# Altium integrated library EwgMicrochips.IntLib: 118 symbols (part 1 of 2) (continued)
## MAX9744
designator DD?
Усилитель аудио; Производитель: Maxim; Тип монтажа: Поверхностный; Характеристики: 20Вт класс D 5-12В стерео; Наименование: MAX9744; Тип компонента: Усилитель аудио
footprint VQFN44_P
pins: 0 PGND, 1 BOOT_L+, 2 OUT_L+, 3 OUT_L+, 4 PVDD, 5 PVDD, 6 VDD, 7 GND, 8 SDA/VOL, 9 SCL, 10 VDD, 11 GND, 12 GND, 13 ADDR1, 14 ADDR2, 15 GND, 16 IN_L, 17 FB_L, 18 FB_R, 19 IN_R, 20 BIAS, 21 VDD, 22 ~{SHDN}, 24 MUTE, 25 SYNC, 26 SYNCOUT, 27 GND, 28 VDD, 29 PVDD, 30 PVDD, 31 OUT_R+, 32 OUT_R+, 33 BOOT_R+, 34 PGND, 35 PGND, 36 OUT_R-, 37 OUT_R-, 38 BOOT_R-, 39 PGND, 40 BOOT_L-, 41 OUT_L-, 42 OUT_L-, 43 PGND, 44 PGND
text: ,

## MAX13443
designator DD?
Интерфейс RS485; Производитель: Maxim Semiconductor; Тип корпуса: SO8; Тип монтажа: Поверхностный; Характеристики: 10Мбит/с, 128 устройств на линии; Наименование: MAX13443; Тип компонента: Интерфейс RS485
footprint SO8
pins: 1 RO (out), 2 ~{RE}, 3 DE, 4 DI (in), 5 GND, 6 A, 7 B, 8 VCC

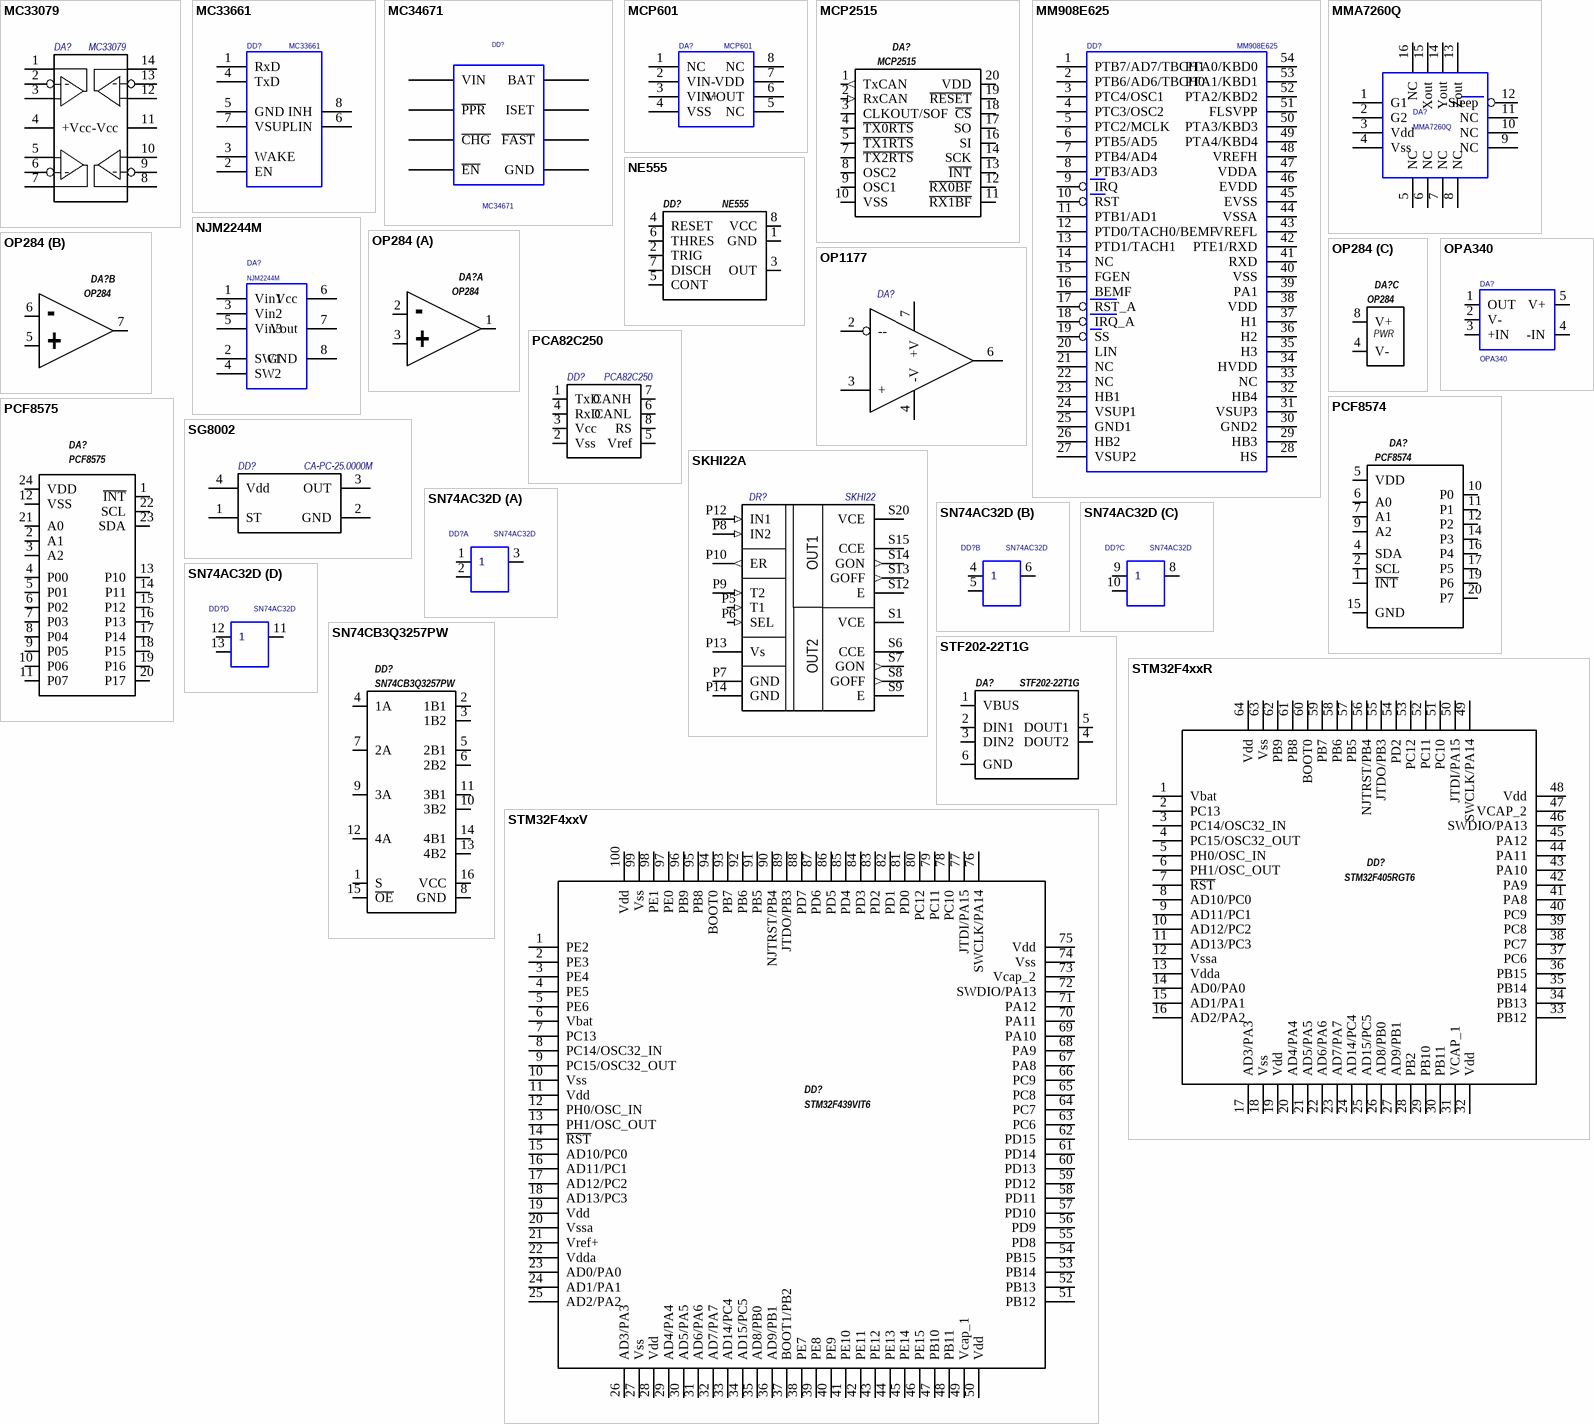
[diagram p5: symbols MC33079 to STM32F4xxV]

## MC33079
designator DA?
Микросхема - Операционный усилитель; Наименование: ON Semiconductor, MC33079D; Тип корпуса: SO14; Тип монтажа: Поверхностный; Тип компонента: Микросхема - Операционный усилитель
footprint SO14
pins: 1, 2, 3, 4 +Vcc, 5, 6, 7, 8, 9, 10, 11 -Vcc, 12, 13, 14

## MC33661
designator DD?
Микросхема - Драйвер LIN; Наименование: Freescale Semiconductor, MC33661; Тип корпуса: SO8; Тип монтажа: Поверхностный; Value: *; Тип компонента: Микросхема - Драйвер LIN
footprint SO8
pins: 1 RxD, 2 EN, 3 WAKE, 4 TxD, 5 GND, 6 LIN, 7 VSUP, 8 INH

## MC34671
designator DD?
Микросхема - Контроль заряда; Наименование: Freescale Semiconductor, MC34671AEPR2; Тип корпуса: UDFN; Тип монтажа: Поверхностный; Value: *; Тип компонента: Микросхема - Контроль заряда
footprint MC34671
pins: 1 VIN, 2 ~{PPR}, 3 ~{CHG}, 4 ~{EN}, 5 GND, 6 ~{FAST}, 7 ISET, 8 BAT, 9 hidden

## MCP601
designator DA?
Микросхема - Операционный усилитель; Наименование: Microchip, MCP601-I/SN; Тип корпуса: SO8; Тип монтажа: Поверхностный; Value: *; Тип компонента: Микросхема - Операционный усилитель
footprint SO8
pins: 1 NC, 2 VIN-, 3 VIN+, 4 VSS, 5 NC, 6 VOUT, 7 VDD, 8 NC

## MCP2515
designator DA?
Интерфейс CAN SPI; Производитель: Microchip; Тип корпуса: SSOP20; Тип монтажа: Поверхностный; Характеристики: 1Мб/с; Наименование: MCP2515; Тип компонента: Интерфейс CAN SPI
footprint SSOP20-4.4
pins: 1 TxCAN (out), 2 RxCAN (in), 3 CLKOUT/SOF, 4 ~{TX0RTS}, 5 ~{TX1RTS}, 7 ~{TX2RTS}, 8 OSC2, 9 OSC1, 10 VSS, 11 ~{RX1BF}, 12 ~{RX0BF}, 13 ~{INT}, 14 SCK, 16 SI, 17 SO, 18 ~{CS}, 19 ~{RESET}, 20 VDD

## MM908E625
designator DD?
Микросхема - Драйвер двигателя; Наименование: Freescale Semiconductor, MM908E625; Тип корпуса: SOIC54_WB-EP; Тип монтажа: Поверхностный; Value: *; Тип компонента: Микросхема - Драйвер двигателя
footprint SOIC54_WB-EP
pins: 1 PTB7/AD7/TBCH1, 2 PTB6/AD6/TBCH0, 3 PTC4/OSC1, 4 PTC3/OSC2, 5 PTC2/MCLK, 6 PTB5/AD5, 7 PTB4/AD4, 8 PTB3/AD3, 9 IRQ, 10 RST, 11 PTB1/AD1, 12 PTD0/TACH0/BEMF, 13 PTD1/TACH1, 14 NC, 15 FGEN, 16 BEMF, 17 RST_A, 18 IRQ_A, 19 SS, 20 LIN, 21 NC, 22 NC, 23 HB1, 24 VSUP1, 25 GND1, 26 HB2, 27 VSUP2, 28 HS, 29 HB3, 30 GND2, 31 VSUP3, 32 HB4, 33 NC, 34 HVDD, 35 H3, 36 H2, 37 H1, 38 VDD, 39 PA1, 40 VSS, 41 RXD, 42 PTE1/RXD, 43 VREFL, 44 VSSA, 45 EVSS, 46 EVDD, 47 VDDA, 48 VREFH, 49 PTA4/KBD4, 50 PTA3/KBD3, 51 FLSVPP, 52 PTA2/KBD2, 53 PTA1/KBD1, 54 PTA0/KBD0, 55 GND (power) hidden

## MMA7260Q
designator DA?
Датчик - Акселерометр; Наименование: Freescale, MMA7260Q; Тип корпуса: QFN; Тип монтажа: Поверхностный; Value: *; Тип компонента: Датчик - Акселерометр
footprint QFN
pins: 1 G1, 2 G2, 3 Vdd, 4 Vss, 5 NC, 6 NC, 7 NC, 8 NC, 9 NC, 10 NC, 11 NC, 12 Sleep, 13 Zout, 14 Yout, 15 Xout, 16 NC, 17 hidden

## NE555
designator DD?
Таймер аналоговый; Примечание: Texas Instruments; Тип корпуса: SO8-3.9; Тип монтажа: Поверхностный; Наименование: NE555
footprint SO8-3.9
pins: 1 GND, 2 TRIG, 3 OUT, 4 RESET, 5 CONT, 6 THRES, 7 DISCH, 8 VCC

## NJM2244M
designator DA?
Микросхема - Видео переключатель; Наименование: JRC, NJM2244M; Тип корпуса: SO8; Тип монтажа: Поверхностный; Value: *; Тип компонента: Микросхема - Видео переключатель
footprint SO8
pins: 1 Vin1, 2 SW1, 3 Vin2, 4 SW2, 5 Vin3, 6 Vcc, 7 Vout, 8 GND

## OP284
designator DA?
Операционный усилитель; Производитель: Analog Devices; Тип корпуса: SO8; Тип монтажа: Поверхностный; Характеристики: 3-36В, 10мА, rail-to-rail 200мВ, 4МГц; Наименование: OP284; Тип компонента: Операционный усилитель
footprint SO8-3.9
part A pins: 1 outA, 2 -inA, 3 +inA
part B pins: 5 +inB, 6 -inB, 7 outB
part C pins: 4 V-, 8 V+
part A text: -; +
part B text: -; +
part C text: PWR

## OP1177
designator DA?  (value not drawn)
Микросхема - Операционный усилитель; Наименование: Analog Devices, OP1177; Тип корпуса: SO8; Тип монтажа: Поверхностный; Тип компонента: Микросхема - Операционный усилитель
footprint SO8
pins: 2 --, 3 +, 4 -V, 6 Vout, 7 +V

## OPA340
designator DA?
Микросхема - Операционный усилитель; Наименование: Texas Instruments, OPA340NA/250; Тип корпуса: SOT-23-5; Тип монтажа: Поверхностный; Value: *; Тип компонента: Микросхема - Операционный усилитель
footprint SOT23-5
pins: 1 OUT, 2 V-, 3 +IN, 4 -IN, 5 V+

## PCA82C250
designator DD?
Микросхема - Драйвер CAN; Наименование: NXP, PCA82C250T; Тип корпуса: SO8; Тип монтажа: Поверхностный; Value: *; Тип компонента: Микросхема - Драйвер CAN
footprint SO8
pins: 1 TxD, 2 Vss, 3 Vcc, 4 RxD, 5 Vref, 6 CANL, 7 CANH, 8 RS
1 alternate drawing of the same symbol

## PCF8574
designator DA?
Расширитель ввода-вывода 8 кан.; Производитель: NXP; Тип корпуса: SSOP20; Тип монтажа: Поверхностный; Наименование: PCF8574; Тип компонента: Расширитель ввода-вывода 8 кан.
footprint SSOP20-4.4
pins: 1 ~{INT}, 2 SCL, 4 SDA, 5 VDD, 6 A0, 7 A1, 9 A2, 10 P0, 11 P1, 12 P2, 14 P3, 15 GND, 16 P4, 17 P5, 19 P6, 20 P7

## PCF8575
designator DA?
Расширитель ввода-вывода 8 кан.; Производитель: NXP; Тип корпуса: SSOP20; Тип монтажа: Поверхностный; Наименование: PCF8575; Тип компонента: Расширитель ввода-вывода 8 кан.
footprint SSOP24-5.3
pins: 1 ~{INT}, 2 A1, 3 A2, 4 P00, 5 P01, 6 P02, 7 P03, 8 P04, 9 P05, 10 P06, 11 P07, 12 VSS, 13 P10, 14 P11, 15 P12, 16 P13, 17 P14, 18 P15, 19 P16, 20 P17, 21 A0, 22 SCL, 23 SDA, 24 VDD

## SG8002
designator DD?, comment CA-PC-25.0000M
Прогр. генератор Мгц; Наименование: SG-8002CA-25.000 M SCM Epson; Примечание: SG-8002JF-40.000 M SCM Epson; Тип монтажа: Поверхностный; Value: CA-PC-25.0000M; Тип компонента: Прогр. генератор Мгц
footprint SG8002 (PROGRAMMABLE HIGH-FREQUENCY CRYSTAL OSCILLATOR)
pins: 1 ST, 2 GND, 3 OUT, 4 Vdd

## SKHI22A
designator DR?, comment SKHI22
Микросхема - Драйвер IGBT; Наименование: SEMIKRON, SKHI22A/R; Тип монтажа: Штыревой; Value: *; Тип компонента: Микросхема - Драйвер IGBT
footprint SKHI22 (IGBT DRIVER)
pins: P5 T1 (in), P6 SEL (in), P7 GND (power), P8 IN2 (in), P9 T2 (in), P10 ER (out), P11 NC hidden, P12 IN1 (in), P13 Vs (power), P14 GND (power), S1 VCE, S6 CCE, S7 GON (out), S8 GOFF (out), S9 E, S12 E, S13 GOFF (out), S14 GON (out), S15 CCE, S20 VCE
text: OUT1; OUT2

## SN74AC32D
designator DD?
Микросхема - Логика; Тип корпуса: SO14; Тип монтажа: Поверхностный; Value: *; Наименование: SN74AC32D; Тип компонента: Микросхема - Логика
footprint SO14
pins on every part: 7 GND (power) hidden, 14 5V (power) hidden
part A pins: 1 1A, 2 1B, 3 1Y
part B pins: 4 2A, 5 2B, 6 2Y
part C pins: 8 3Y, 9 3A, 10 3B
part D pins: 11 4Y, 12 4A, 13 4B

## SN74CB3Q3257PW
designator DD?
Мультиплексор 2:1 4кан.; Производитель: Texas Instruments; Тип корпуса: TSSOP16; Тип монтажа: Поверхностный; Характеристики: 500МГц 6.5нс; Наименование: SN74CB3Q3257PW
footprint SSOP16-4.4
pins: 1 S, 2 1B1, 3 1B2, 4 1A, 5 2B1, 6 2B2, 7 2A, 8 GND, 9 3A, 10 3B2, 11 3B1, 12 4A, 13 4B2, 14 4B1, 15 ~{OE}, 16 VCC

## STF202-22T1G
designator DA?
Интерфейс USB защита+фильтр; Производитель: ON Semiconductor; Тип корпуса: SOT23-6; Тип монтажа: Поверхностный; Наименование: STF202-22T1G; Тип компонента: Интерфейс USB защита+фильтр
footprint SOT23-6
pins: 1 VBUS, 2 DIN1, 3 DIN2, 4 DOUT2, 5 DOUT1, 6 GND

## STM32F4xxR
designator DD?, comment STM32F405RGT6
Микроконтроллер; Производитель: STMicroelectronics; Тип корпуса: LQFP64; Тип монтажа: Поверхностный; Наименование: STM32F405RGT6; Тип компонента: Микроконтроллер
footprint LQFP64
pins: 1 Vbat, 2 PC13, 3 PC14/OSC32_IN, 4 PC15/OSC32_OUT, 5 PH0/OSC_IN, 6 PH1/OSC_OUT, 7 ~{RST}, 8 AD10/PC0, 9 AD11/PC1, 10 AD12/PC2, 11 AD13/PC3, 12 Vssa, 13 Vdda, 14 AD0/PA0, 15 AD1/PA1, 16 AD2/PA2, 17 AD3/PA3, 18 Vss, 19 Vdd, 20 AD4/PA4, 21 AD5/PA5, 22 AD6/PA6, 23 AD7/PA7, 24 AD14/PC4, 25 AD15/PC5, 26 AD8/PB0, 27 AD9/PB1, 28 PB2, 29 PB10, 30 PB11, 31 VCAP_1, 32 Vdd, 33 PB12, 34 PB13, 35 PB14, 36 PB15, 37 PC6, 38 PC7, 39 PC8, 40 PC9, 41 PA8, 42 PA9, 43 PA10, 44 PA11, 45 PA12, 46 SWDIO/PA13, 47 VCAP_2, 48 Vdd, 49 SWCLK/PA14, 50 JTDI/PA15, 51 PC10, 52 PC11, 53 PC12, 54 PD2, 55 JTDO/PB3, 56 NJTRST/PB4, 57 PB5, 58 PB6, 59 PB7, 60 BOOT0, 61 PB8, 62 PB9, 63 Vss, 64 Vdd

## STM32F4xxV
designator DD?, comment STM32F439VIT6
Микроконтроллер; Производитель: STMicroelectronics; Тип корпуса: LQFP100; Тип монтажа: Поверхностный; Наименование: STM32F439VIT6; Тип компонента: Микроконтроллер
footprint LQFP100
pins: 1 PE2, 2 PE3, 3 PE4, 4 PE5, 5 PE6, 6 Vbat, 7 PC13, 8 PC14/OSC32_IN, 9 PC15/OSC32_OUT, 10 Vss, 11 Vdd, 12 PH0/OSC_IN, 13 PH1/OSC_OUT, 14 ~{RST}, 15 AD10/PC0, 16 AD11/PC1, 17 AD12/PC2, 18 AD13/PC3, 19 Vdd, 20 Vssa, 21 Vref+, 22 Vdda, 23 AD0/PA0, 24 AD1/PA1, 25 AD2/PA2, 26 AD3/PA3, 27 Vss, 28 Vdd, 29 AD4/PA4, 30 AD5/PA5, 31 AD6/PA6, 32 AD7/PA7, 33 AD14/PC4, 34 AD15/PC5, 35 AD8/PB0, 36 AD9/PB1, 37 BOOT1/PB2, 38 PE7, 39 PE8, 40 PE9, 41 PE10, 42 PE11, 43 PE12, 44 PE13, 45 PE14, 46 PE15, 47 PB10, 48 PB11, 49 Vcap_1, 50 Vdd, 51 PB12, 52 PB13, 53 PB14, 54 PB15, 55 PD8, 56 PD9, 57 PD10, 58 PD11, 59 PD12, 60 PD13, 61 PD14, 62 PD15, 63 PC6, 64 PC7, 65 PC8, 66 PC9, 67 PA8, 68 PA9, 69 PA10, 70 PA11, 71 PA12, 72 SWDIO/PA13, 73 Vcap_2, 74 Vss, 75 Vdd, 76 SWCLK/PA14, 77 JTDI/PA15, 78 PC10, 79 PC11, 80 PC12, 81 PD0, 82 PD1, 83 PD2, 84 PD3, 85 PD4, 86 PD5, 87 PD6, 88 PD7, 89 JTDO/PB3, 90 NJTRST/PB4, 91 PB5, 92 PB6, 93 PB7, 94 BOOT0, 95 PB8, 96 PB9, 97 PE0, 98 PE1, 99 Vss, 100 Vdd

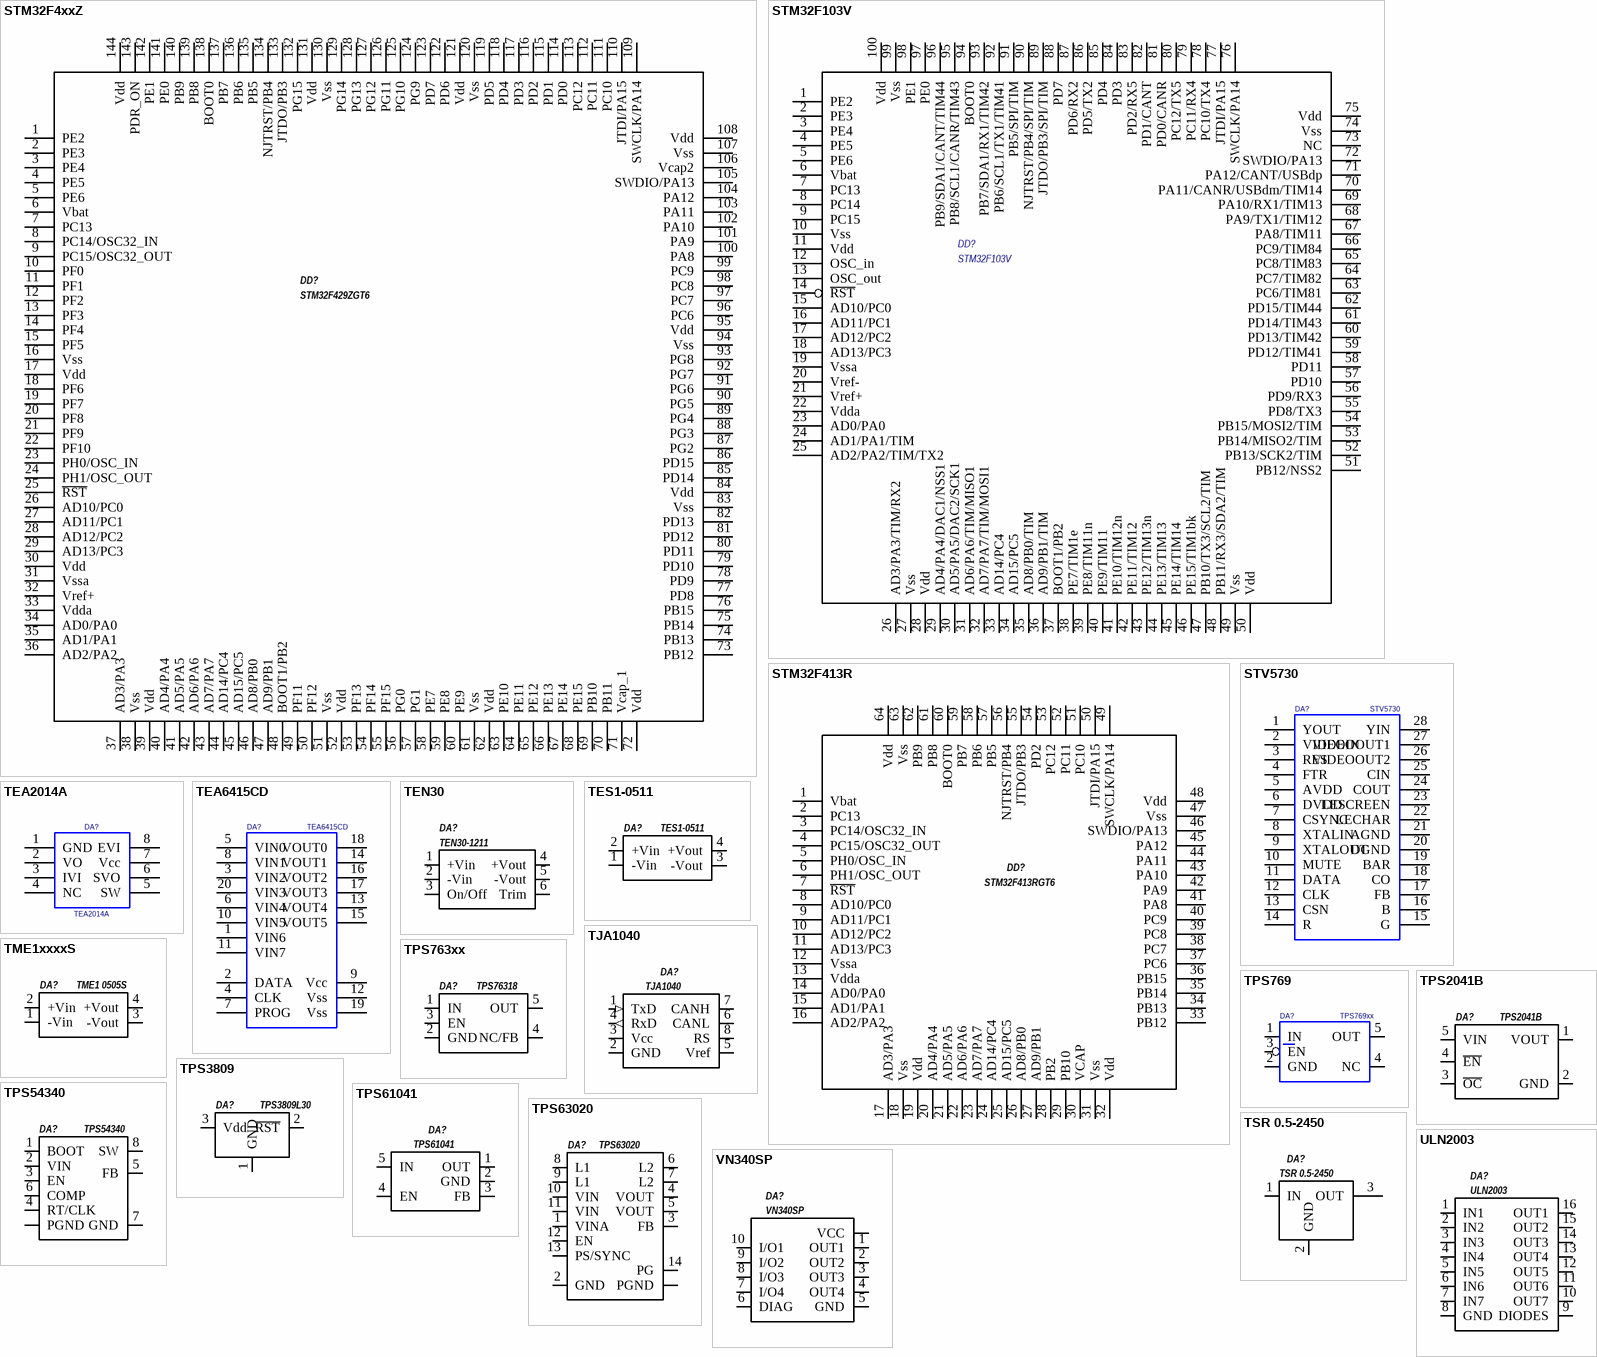
[diagram p6: symbols STM32F4xxZ to VN340SP]

## STM32F4xxZ
designator DD?, comment STM32F429ZGT6
Микроконтроллер; Производитель: STMicroelectronics; Тип корпуса: LQFP144; Тип монтажа: Поверхностный; Наименование: STM32F429ZGT6; Тип компонента: Микроконтроллер
footprint LQFP144
pins: 1 PE2, 2 PE3, 3 PE4, 4 PE5, 5 PE6, 6 Vbat, 7 PC13, 8 PC14/OSC32_IN, 9 PC15/OSC32_OUT, 10 PF0, 11 PF1, 12 PF2, 13 PF3, 14 PF4, 15 PF5, 16 Vss, 17 Vdd, 18 PF6, 19 PF7, 20 PF8, 21 PF9, 22 PF10, 23 PH0/OSC_IN, 24 PH1/OSC_OUT, 25 ~{RST}, 26 AD10/PC0, 27 AD11/PC1, 28 AD12/PC2, 29 AD13/PC3, 30 Vdd, 31 Vssa, 32 Vref+, 33 Vdda, 34 AD0/PA0, 35 AD1/PA1, 36 AD2/PA2, 37 AD3/PA3, 38 Vss, 39 Vdd, 40 AD4/PA4, 41 AD5/PA5, 42 AD6/PA6, 43 AD7/PA7, 44 AD14/PC4, 45 AD15/PC5, 46 AD8/PB0, 47 AD9/PB1, 48 BOOT1/PB2, 49 PF11, 50 PF12, 51 Vss, 52 Vdd, 53 PF13, 54 PF14, 55 PF15, 56 PG0, 57 PG1, 58 PE7, 59 PE8, 60 PE9, 61 Vss, 62 Vdd, 63 PE10, 64 PE11, 65 PE12, 66 PE13, 67 PE14, 68 PE15, 69 PB10, 70 PB11, 71 Vcap_1, 72 Vdd, 73 PB12, 74 PB13, 75 PB14, 76 PB15, 77 PD8, 78 PD9, 79 PD10, 80 PD11, 81 PD12, 82 PD13, 83 Vss, 84 Vdd, 85 PD14, 86 PD15, 87 PG2, 88 PG3, 89 PG4, 90 PG5, 91 PG6, 92 PG7, 93 PG8, 94 Vss, 95 Vdd, 96 PC6, 97 PC7, 98 PC8, 99 PC9, 100 PA8, 101 PA9, 102 PA10, 103 PA11, 104 PA12, 105 SWDIO/PA13, 106 Vcap2, 107 Vss, 108 Vdd, 109 SWCLK/PA14, 110 JTDI/PA15, 111 PC10, 112 PC11, 113 PC12, 114 PD0, 115 PD1, 116 PD2, 117 PD3, 118 PD4, 119 PD5, 120 Vss, 121 Vdd, 122 PD6, 123 PD7, 124 PG9, 125 PG10, 126 PG11, 127 PG12, 128 PG13, 129 PG14, 130 Vss, 131 Vdd, 132 PG15, 133 JTDO/PB3, 134 NJTRST/PB4, 135 PB5, 136 PB6, 137 PB7, 138 BOOT0, 139 PB8, 140 PB9, 141 PE0, 142 PE1, 143 PDR_ON, 144 Vdd

## STM32F103V
designator DD?
Микроконтроллер; Тип корпуса: LQFP100; Тип монтажа: Поверхностный; Value: STM32F103V; Наименование: STM32F103V; Тип компонента: Микроконтроллер
footprint LQFP100
pins: 1 PE2, 2 PE3, 3 PE4, 4 PE5, 5 PE6, 6 Vbat, 7 PC13, 8 PC14, 9 PC15, 10 Vss, 11 Vdd, 12 OSC_in, 13 OSC_out, 14 ~{RST}, 15 AD10/PC0, 16 AD11/PC1, 17 AD12/PC2, 18 AD13/PC3, 19 Vssa, 20 Vref-, 21 Vref+, 22 Vdda, 23 AD0/PA0, 24 AD1/PA1/TIM, 25 AD2/PA2/TIM/TX2, 26 AD3/PA3/TIM/RX2, 27 Vss, 28 Vdd, 29 AD4/PA4/DAC1/NSS1, 30 AD5/PA5/DAC2/SCK1, 31 AD6/PA6/TIM/MISO1, 32 AD7/PA7/TIM/MOSI1, 33 AD14/PC4, 34 AD15/PC5, 35 AD8/PB0/TIM, 36 AD9/PB1/TIM, 37 BOOT1/PB2, 38 PE7/TIM1e, 39 PE8/TIM11n, 40 PE9/TIM11, 41 PE10/TIM12n, 42 PE11/TIM12, 43 PE12/TIM13n, 44 PE13/TIM13, 45 PE14/TIM14, 46 PE15/TIM1bk, 47 PB10/TX3/SCL2/TIM, 48 PB11/RX3/SDA2/TIM, 49 Vss, 50 Vdd, 51 PB12/NSS2, 52 PB13/SCK2/TIM, 53 PB14/MISO2/TIM, 54 PB15/MOSI2/TIM, 55 PD8/TX3, 56 PD9/RX3, 57 PD10, 58 PD11, 59 PD12/TIM41, 60 PD13/TIM42, 61 PD14/TIM43, 62 PD15/TIM44, 63 PC6/TIM81, 64 PC7/TIM82, 65 PC8/TIM83, 66 PC9/TIM84, 67 PA8/TIM11, 68 PA9/TX1/TIM12, 69 PA10/RX1/TIM13, 70 PA11/CANR/USBdm/TIM14, 71 PA12/CANT/USBdp, 72 SWDIO/PA13, 73 NC, 74 Vss, 75 Vdd, 76 SWCLK/PA14, 77 JTDI/PA15, 78 PC10/TX4, 79 PC11/RX4, 80 PC12/TX5, 81 PD0/CANR, 82 PD1/CANT, 83 PD2/RX5, 84 PD3, 85 PD4, 86 PD5/TX2, 87 PD6/RX2, 88 PD7, 89 JTDO/PB3/SPI/TIM, 90 NJTRST/PB4/SPI/TIM, 91 PB5/SPI/TIM, 92 PB6/SCL1/TX1/TIM41, 93 PB7/SDA1/RX1/TIM42, 94 BOOT0, 95 PB8/SCL1/CANR/TIM43, 96 PB9/SDA1/CANT/TIM44, 97 PE0, 98 PE1, 99 Vss, 100 Vdd